# Altium footprint library PcbLib1.PcbLib: 4 footprints
Each footprint in its own frame and in the unit in brackets; x right, y up, seen from the top. Pads: shape width x height; smd on the part's side, far side on the other; paste and mask are expansions set on the pad; w line width, h text height; cw(c..) or ccw(c..) is an arc to the next point about the centre after c.
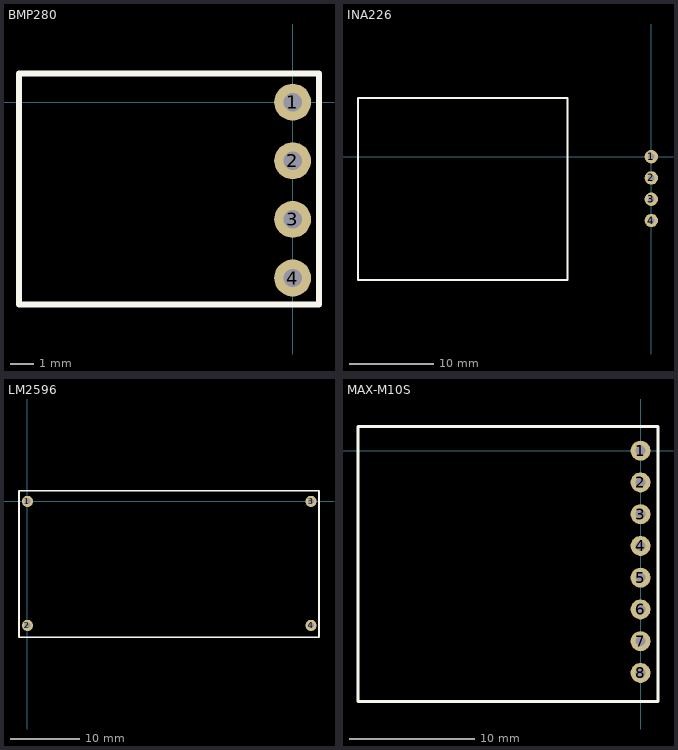
[diagram p0: the footprints below, top view; thin cyan lines are the x and y axes]

## BMP280 [mm]
pads (4):
  round 1.6 hole 0.8: 1(0,0) 2(0,-2.54) 3(0,-5.08) 4(0,-7.62)
Top Overlay:
  lines w0.254: -11.857,-8.763 1.143,-8.763 1.143,1.237 -11.857,1.237 -11.857,-8.763
3D body "BME 280.step": height 2.5, standoff -8.5, extent -11.757,-8.763 1.343,1.237

## INA226 [mm]
pads (4):
  round 1.6 hole 0.8: 1(0,0) 2(0,-2.54) 3(0,-5.08) 4(0,-7.62)
Top Overlay:
  lines w0.254: -35,-14.732 -10,-14.732 -10,7.014 -35,7.014 -35,-14.732
3D body "INA_226 step.step": height 11.5, standoff -2.5, extent -34.925,-13.97 -0.272,6.53

## LM2596 [mm]
pads (4):
  round 1.6 hole 0.8: 1(0,0) 2(0,-17.78) 3(40.64,0) 4(40.64,-17.78)
Top Overlay:
  lines w0.254: -1.217,-19.476 41.783,-19.476 41.783,1.524 -1.217,1.524 -1.217,-19.476
3D body "converter.step": height 16.8, standoff -3, extent -1.48,-19.54 42.12,1.76

## MAX-M10S [mm]
pads (8):
  round 1.6 hole 0.8: 1(0,0) 2(0,-2.54) 3(0,-5.08) 4(0,-7.62) 5(0,-10.16) 6(0,-12.7) 7(0,-15.24) 8(0,-17.78)
Top Overlay:
  lines w0.254: -22.603,-20.066 1.397,-20.066 1.397,1.934 -22.603,1.934 -22.603,-20.066
3D body "PCB1.step": height 4.67, standoff -9.12, extent -32.09,-19.812 1.864,2.188